# Altium footprint library connectors_headers.PcbLib: 60 footprints (part 3 of 4)
Each footprint in its own frame and in the unit in brackets; x right, y up, seen from the top. Pads: shape width x height; smd on the part's side, far side on the other; paste and mask are expansions set on the pad; w line width, h text height; cw(c..) or ccw(c..) is an arc to the next point about the centre after c.
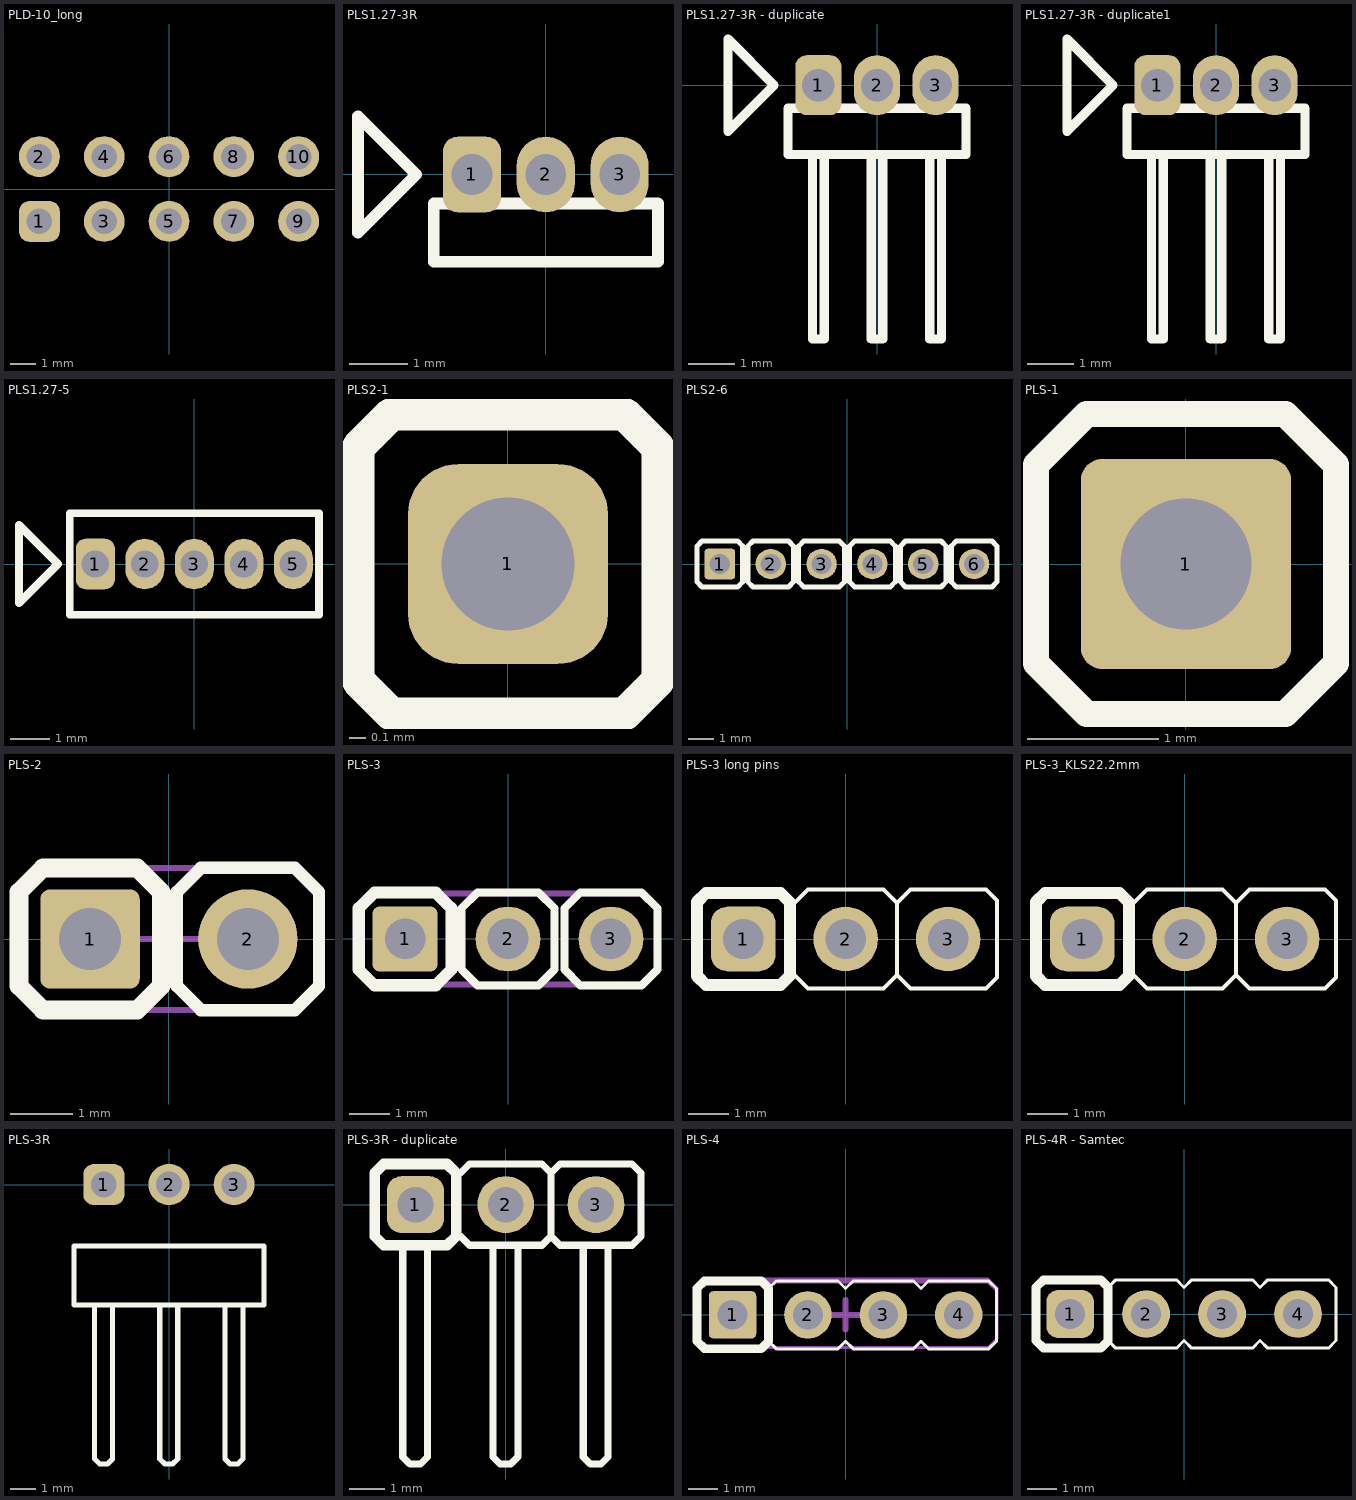
[diagram p2: the footprints below, top view; thin cyan lines are the x and y axes]

## PLD-10_long [mm] "TSW-105-15-G-D Samtec Inc"
height 0.025
pads (10):
  rrect50% 1.6x1.6 hole 1 mask+0.127: 1(-5.08,-1.27)
  round 1.6 hole 1 mask+0.127: 2(-5.08,1.27) 3(-2.54,-1.27) 4(-2.54,1.27) 5(0,-1.27) 6(0,1.27) 7(2.54,-1.27) 8(2.54,1.27) 9(5.08,-1.27) 10(5.08,1.27)
3D body "TSW-105-15-G-D.stp": height 15.75, standoff -2.79, extent -6.35,-2.54 6.35,2.54

## PLS1.27-3R [mm] "M50-3930342"
height 0.025
pads (3):
  rrect50% 1x1.3 hole 0.7: 1(-1.27,0)
  oval 1x1.3 hole 0.7: 2(0,0) 3(1.27,0)
Top Overlay:
  lines w0.2: 1.93,-1.3 1.93,-0.5 ; 1.93,-0.5 1.93,-1.5 -1.93,-1.5 -1.93,-0.5 1.93,-0.5 ; -3.23,-1 -3.23,1 -2.23,0 -3.23,-1
3D body "m50-3930342_asm.stp": height 2.15, standoff -2.35, extent -1.905,-5.5 1.905,0.2

## PLS1.27-3R - duplicate [mm] "M50-3930342"
height 0.025
pads (3):
  rrect50% 1x1.3 hole 0.7: 1(-1.27,0)
  oval 1x1.3 hole 0.7: 2(0,0) 3(1.27,0)
Top Overlay:
  lines w0.2: -1.397,-1.5 -1.397,-5.5 -1.143,-5.5 -1.143,-1.5 ; -0.127,-1.5 -0.127,-5.5 0.127,-5.5 0.127,-1.5 ; 1.143,-1.5 1.143,-5.5 1.397,-5.5 1.397,-1.5 ; 1.93,-1.3 1.93,-0.5 ; 1.93,-0.5 1.93,-1.5 -1.93,-1.5 -1.93,-0.5 1.93,-0.5 ; -3.23,-1 -3.23,1 -2.23,0 -3.23,-1
3D body "m50-3930342_asm.stp": height 2.15, standoff -2.35, extent -1.905,-5.5 1.905,0.2

## PLS1.27-3R - duplicate1 [mm] "M50-3930342"
height 0.025
pads (3):
  rrect50% 1x1.3 hole 0.7: 1(-1.27,0)
  oval 1x1.3 hole 0.7: 2(0,0) 3(1.27,0)
Top Overlay:
  lines w0.2: -1.397,-1.5 -1.397,-5.5 -1.143,-5.5 -1.143,-1.5 ; -0.127,-1.5 -0.127,-5.5 0.127,-5.5 0.127,-1.5 ; 1.143,-1.5 1.143,-5.5 1.397,-5.5 1.397,-1.5 ; 1.93,-1.3 1.93,-0.5 ; 1.93,-0.5 1.93,-1.5 -1.93,-1.5 -1.93,-0.5 1.93,-0.5 ; -3.23,-1 -3.23,1 -2.23,0 -3.23,-1
3D body "m50-3930342_asm.stp": height 2.15, standoff -2.35, extent -1.905,-5.5 1.905,0.2

## PLS1.27-5 [mm]
height 0.025
pads (5):
  rrect50% 1x1.3 hole 0.7: 1(-2.54,0)
  oval 1x1.3 hole 0.7: 2(-1.27,0) 3(0,0) 4(1.27,0) 5(2.54,0)
Top Overlay:
  lines w0.2: -4.5,-1 -4.5,1 -3.5,0 -4.5,-1 ; -3.2,-1.3 3.2,-1.3 3.2,1.3 -3.2,1.3 -3.2,-1.3
3D body "m52-040023v0545_asm.stp": height 6.5, standoff -2.3, extent -3.175,-1.255 3.175,1.245

## PLS2-1 [mm]
height 0.025
pads (1):
  rrect50% 1.2x1.2 hole 0.8: 1(0,0)
Top Overlay:
  lines w0.2: -0.9,-0.7 -0.9,0.7 -0.7,0.9 0.7,0.9 0.9,0.7 0.9,-0.7 0.7,-0.9 -0.7,-0.9 -0.9,-0.7
3D body "User Library-pls2-1.step": height 6.05, standoff -2.75, extent -1,-1 1,1

## PLS2-6 [mm]
height 0.025
pads (6):
  rrect20% 1.2x1.2 hole 0.8: 1(-5,0)
  round 1.2 hole 0.8: 2(-3,0) 3(-1,0) 4(1,0) 5(3,0) 6(5,0)
Top Overlay:
  lines w0.2: -5.9,-0.7 -5.9,0.7 -5.7,0.9 -4.3,0.9 -4.1,0.7 -4.1,-0.7 -4.3,-0.9 -5.7,-0.9 -5.9,-0.7 ; -3.9,-0.7 -3.7,-0.9 -2.3,-0.9 -2.1,-0.7 -2.1,0.7 -2.3,0.9 -3.7,0.9 -3.9,0.7 -3.9,-0.7 ; -1.9,-0.7 -1.7,-0.9 -0.3,-0.9 -0.1,-0.7 -0.1,0.7 -0.3,0.9 -1.7,0.9 -1.9,0.7 -1.9,-0.7 ; 0.1,-0.7 0.3,-0.9 1.7,-0.9 1.9,-0.7 1.9,0.7 1.7,0.9 0.3,0.9 0.1,0.7 0.1,-0.7 ; 2.1,-0.7 2.3,-0.9 3.7,-0.9 3.9,-0.7 3.9,0.7 3.7,0.9 2.3,0.9 2.1,0.7 2.1,-0.7 ; 4.1,-0.7 4.3,-0.9 5.7,-0.9 5.9,-0.7 5.9,0.7 5.7,0.9 4.3,0.9 4.1,0.7 4.1,-0.7
3D body "User Library-pls2-1.step": height 6.05, standoff -2.75, extent -6,-1 -4,1
3D body "User Library-pls2-1.step": height 6.05, standoff -2.75, extent -4,-1 -2,1
3D body "User Library-pls2-1.step": height 6.05, standoff -2.75, extent -2,-1 0,1
3D body "User Library-pls2-1.step": height 6.05, standoff -2.75, extent 0,-1 2,1
3D body "User Library-pls2-1.step": height 6.05, standoff -2.75, extent 2,-1 4,1
3D body "User Library-pls2-1.step": height 6.05, standoff -2.75, extent 4,-1 6,1

## PLS-1 [mm] "2211S-01G (PLS-01), DS1021-1x1SF11-B"
height 0.025
pads (1):
  rrect20% 1.6x1.6 hole 1: 1(0,0)
Top Overlay:
  lines w0.2: -1.143,-0.757 -1.143,0.757 -0.757,1.143 0.757,1.143 1.143,0.757 1.143,-0.757 0.757,-1.143 -0.757,-1.143 -1.143,-0.757
M3_comm_top:
  text ".comment" at -0.9,-0.3 h1
M5_asm_top:
  lines w0.1: -1.143,-0.757 -0.757,-1.143 0.757,-1.143 1.143,-0.757 1.143,0.757 0.757,1.143 -0.757,1.143 -1.143,0.757 -1.143,-0.757
  text ".Designator" at -1,1.4 h1
M7_courtyard_top:
  lines w0.1: -0.5,0 0.5,0 ; 0,-0.5 0,0.5 ; -1.143,-0.757 -1.143,0.757 -0.757,1.143 0.757,1.143 1.143,0.757 1.143,-0.757 0.757,-1.143 -0.757,-1.143 -1.143,-0.757
3D body "User Library-PLS-1.step": height 8.49, standoff -2.95, extent -1.27,-1.27 1.27,1.27

## PLS-2 [mm]
height 0.025
pads (2):
  rrect20% 1.6x1.6 hole 1: 1(-1.27,0)
  round 1.6 hole 1: 2(1.27,0)
Top Overlay:
  lines w0.2: 0.127,-0.757 0.127,0.757 0.513,1.143 2.027,1.143 2.413,0.757 2.413,-0.757 2.027,-1.143 0.513,-1.143 0.127,-0.757
  lines w0.3: -2.413,-0.757 -2.413,0.757 -2.027,1.143 -0.513,1.143 -0.127,0.757 -0.127,-0.757 -0.513,-1.143 -2.027,-1.143 -2.413,-0.757
M3_comm_top:
  text ".comment" at -1.027,-0.3 h1
M5_asm_top:
  lines w0.1: -2.413,-0.757 -2.413,0.757 -2.027,1.143 -0.513,1.143 0.513,1.143 2.027,1.143 2.413,0.757 2.413,-0.757 2.027,-1.143 0.513,-1.143 -0.513,-1.143 -2.027,-1.143 -2.413,-0.757
  text ".Designator" at -1.5,1.4 h1
M7_courtyard_top:
  lines w0.1: -0.5,0 0.5,0 ; -0.001,0.5 0,-0.5 ; -2.4,-0.77 -2.4,0.8 -2.057,1.143 0.513,1.143 2.027,1.143 2.413,0.757 2.413,-0.757 2.027,-1.143 0.513,-1.143 -2.027,-1.143 -2.4,-0.77
3D body "User Library-PLS-1.step": height 8.49, standoff -2.95, extent -2.54,-1.27 0,1.27
3D body "User Library-PLS-1.step": height 8.49, standoff -2.95, extent 0,-1.27 2.54,1.27

## PLS-3 [mm]
height 0.025
pads (3):
  rrect20% 1.6x1.6 hole 1: 1(-2.54,0)
  round 1.6 hole 1: 2(0,0) 3(2.54,0)
Top Overlay:
  lines w0.2: -1.143,-0.757 -0.757,-1.143 0.757,-1.143 1.143,-0.757 1.143,0.757 0.757,1.143 -0.757,1.143 -1.143,0.757 -1.143,-0.757 ; 1.397,-0.757 1.783,-1.143 3.297,-1.143 3.683,-0.757 3.683,0.757 3.297,1.143 1.783,1.143 1.397,0.757 1.397,-0.757
  lines w0.3: -3.683,-0.757 -3.297,-1.143 -1.783,-1.143 -1.397,-0.757 -1.397,0.757 -1.783,1.143 -3.297,1.143 -3.683,0.757 -3.683,-0.757
M3_comm_top:
  text ".comment" at -0.9,-0.3 h1
M5_asm_top:
  lines w0.1: -1.534,1.141 -3.325,1.141 -3.685,0.782 -3.685,-0.785 -3.325,-1.144 -1.548,-1.144 3.325,-1.144 3.685,-0.785 3.685,0.782 3.325,1.141 -1.519,1.141
  text ".Designator" at -1,1.3 h1
M7_courtyard_top:
  lines w0.1: -1.6,-1.1 3.4,-1.1 3.7,-0.8 3.7,0.8 3.4,1.1 -1.6,1.1 ; -1.5,-1.1 -3.4,-1.1 -3.7,-0.8 -3.7,0.8 -3.4,1.1 -1.6,1.1 ; -1.5,1.1 -1.6,1.1 ; -0.5,0 0.5,0 ; 0,-0.5 0,0.5
3D body "PLS-2.STEP": height 10.57, standoff -3.38, extent -1.15,-1.197 3.69,1.143
3D body "PLS-2.STEP": height 10.57, standoff -3.38, extent -3.69,-1.197 1.15,1.143

## PLS-3 long pins [mm] "2211DI-40G-1940 (PLHD-40, KLS1-218-1-40-S-3.0*6.0*19.4)"
height 0.025
pads (3):
  rrect50% 1.6x1.6 hole 1: 1(-2.54,0)
  round 1.6 hole 1: 2(0,0) 3(2.54,0)
Top Overlay:
  lines w0.1: -1.27,-0.889 -0.934,-1.225 0.934,-1.225 1.27,-0.889 ; -1.27,0.889 -0.934,1.225 0.934,1.225 1.27,0.889 ; 1.27,-0.889 1.27,0.889 ; 1.27,-0.889 1.606,-1.225 3.474,-1.225 3.75,-0.949 3.75,0.949 3.474,1.225 1.606,1.225 1.27,0.889 ; 1.27,-0.889 1.27,0.889
  lines w0.3: -3.683,-0.917 -3.683,0.917 -3.457,1.143 -1.618,1.143 -1.375,0.9 -1.375,-0.9 -1.618,-1.143 -3.457,-1.143 -3.683,-0.917
M3_comm_top:
  text ".comment" at -0.9,-0.3 h1
M5_asm_top:
  text ".Designator" at -1,1.3 h1
M7_courtyard_top:
  lines w0.2: -0.5,0 0.5,0 ; 0,-0.5 0,0.5
3D body "DW-03-12-G-S-400.stp": height 23.42, standoff -2.74, extent -3.81,-1.27 3.81,1.27

## PLS-3_KLS22.2mm [mm] "2213DI-80G-2220 (KLS1-218-2-80-S-3.0*6.0*22.2)"
height 0.025
pads (3):
  rrect50% 1.6x1.6 hole 1: 1(-2.54,0)
  round 1.6 hole 1: 2(0,0) 3(2.54,0)
Top Overlay:
  lines w0.1: -1.27,-0.889 -0.934,-1.225 0.934,-1.225 1.27,-0.889 ; -1.27,0.889 -0.934,1.225 0.934,1.225 1.27,0.889 ; 1.27,-0.889 1.27,0.889 ; 1.27,-0.889 1.606,-1.225 3.474,-1.225 3.75,-0.949 3.75,0.949 3.474,1.225 1.606,1.225 1.27,0.889 ; 1.27,-0.889 1.27,0.889
  lines w0.3: -3.683,-0.917 -3.457,-1.143 -1.618,-1.143 -1.375,-0.9 -1.375,0.9 -1.618,1.143 -3.457,1.143 -3.683,0.917 -3.683,-0.917
M3_comm_top:
  text ".comment" at -0.9,-0.3 h1
M5_asm_top:
  text ".Designator" at -1,1.3 h1
M7_courtyard_top:
  lines w0.2: -0.5,0 0.5,0 ; 0,-0.5 0,0.5
3D body "KLS_22.2mm.STEP": height 19.25, standoff -2.95, extent -3.81,-1.27 3.81,1.27

## PLS-3R [mm]
height 0.025
pads (3):
  rrect50% 1.6x1.6 hole 1: 1(-2.54,0)
  round 1.6 hole 1: 2(0,0) 3(2.54,0)
Top Overlay:
  lines w0.2: -2.9,-4.743 -2.9,-10.7 -2.7,-10.9 -2.4,-10.9 -2.2,-10.7 -2.2,-4.743 ; -0.36,-4.743 -0.36,-10.7 -0.16,-10.9 0.14,-10.9 0.34,-10.7 0.34,-4.743 ; 2.18,-4.743 2.18,-10.7 2.38,-10.9 2.68,-10.9 2.88,-10.7 2.88,-4.743 ; -3.7,-4.7 3.7,-4.7 3.7,-2.4 -3.7,-2.4 -3.7,-4.7
3D body "User Library-Header 2 pin RA.STEP": height 2.55, standoff -2.95, extent -3.755,-10.895 1.225,0.325
3D body "User Library-Header 2 pin RA.STEP": height 2.55, standoff -2.95, extent -1.215,-10.895 3.765,0.325

## PLS-3R - duplicate [mm]
height 0.025
pads (3):
  rrect50% 1.6x1.6 hole 1: 1(-2.54,0)
  round 1.6 hole 1: 2(0,0) 3(2.54,0)
Top Overlay:
  lines w0.2: -2.9,-1.143 -2.9,-7.1 -2.7,-7.3 -2.4,-7.3 -2.2,-7.1 -2.2,-1.143 ; -1.27,-0.889 -1.016,-1.143 1.016,-1.143 1.27,-0.889 ; -1.27,0.889 -1.016,1.143 1.016,1.143 1.27,0.889 ; -0.36,-1.143 -0.36,-7.1 -0.16,-7.3 0.14,-7.3 0.34,-7.1 0.34,-1.143 ; 2.18,-1.143 2.18,-7.1 2.38,-7.3 2.68,-7.3 2.88,-7.1 2.88,-1.143 ; 1.27,-0.889 1.27,0.889 ; 1.27,-0.889 1.524,-1.143 3.556,-1.143 3.81,-0.889 3.81,0.889 3.556,1.143 1.524,1.143 1.27,0.889 ; 1.27,-0.889 1.27,0.889
  lines w0.3: -3.683,-0.889 -3.429,-1.143 -1.7,-1.143 -1.651,-1.143 -1.397,-0.889 -1.397,0.889 -1.651,1.143 -3.429,1.143 -3.683,0.889 -3.683,-0.889
3D body "User Library-PLS-3R gold.step": height 5.45, standoff -3, extent -3.81,-7.345 3.81,1.275

## PLS-4 [mm]
height 0.025
pads (4):
  rrect20% 1.6x1.6 hole 1: 1(-3.81,0)
  round 1.6 hole 1: 2(-1.27,0) 3(1.27,0) 4(3.81,0)
Top Overlay:
  lines w0.1: -2.594,-0.889 -2.34,-1.143 ; -2.594,0.889 -2.34,1.143 ; -2.286,-1.143 -0.254,-1.143 0,-0.889 0.254,-1.143 2.286,-1.143 2.54,-0.889 2.794,-1.143 4.826,-1.143 5.08,-0.889 5.08,0.889 4.826,1.143 2.794,1.143 2.54,0.889 2.286,1.143 0.254,1.143 0,0.889 -0.254,1.143 -2.286,1.143
  lines w0.3: -5.007,-0.889 -5.007,0.889 -4.753,1.143 -2.848,1.143 -2.594,0.889 -2.594,-0.889 -2.848,-1.143 -4.753,-1.143 -5.007,-0.889
M3_comm_top:
  text ".comment" at -1,-0.2 h1
M5_asm_top:
  lines w0.1: -2.85,-1.1 4.8,-1.1 5.1,-0.8 5.1,0.9 4.8,1.2 -2.85,1.2 ; -2.8,-1.1 -4.7,-1.1 -5,-0.8 -5,0.9 -4.7,1.2 -2.9,1.2 -2.8,1.2
  text ".Designator" at -1.2,1.5 h1
M7_courtyard_top:
  lines w0.1: -4.9,-1 -5,-0.9 ; -5,-0.9 -4.8,-1.1 -2.8,-1.1 4.8,-1.1 5.1,-0.8 5.1,0.8 4.8,1.1 -2.8,1.1 -4.8,1.1 -5,0.9 -5,-0.9
  lines w0.2: -0.5,0 0.5,0 ; 0,-0.5 0,0.5
3D body "pls-4.stp": height 6.3, standoff -2.9, extent -4.98,-1.251 5.18,1.245

## PLS-4R - Samtec [mm] "TSW-104-08-F-S-RA"
height 0.025
pads (4):
  rrect50% 1.6x1.6 hole 1: 1(-3.81,0)
  round 1.6 hole 1: 2(-1.27,0) 3(1.27,0) 4(3.81,0)
Top Overlay:
  lines w0.1: -2.54,-0.889 -2.286,-1.143 -0.254,-1.143 0,-0.889 0.254,-1.143 2.286,-1.143 2.54,-0.889 2.794,-1.143 4.826,-1.143 5.08,-0.889 5.08,0.889 4.826,1.143 2.794,1.143 2.54,0.889 2.286,1.143 0.254,1.143 0,0.889 -0.254,1.143 -2.286,1.143 -2.54,0.889
  lines w0.3: -4.953,-0.889 -4.953,0.889 -4.699,1.143 -2.794,1.143 -2.54,0.889 -2.54,-0.889 -2.794,-1.143 -4.699,-1.143 -4.953,-0.889
3D body "TSW-104-08-F-S-RA.stp": height 3.07, standoff -2.24, extent -5.08,-9.882 5.08,0.341